# Altium integrated library LEMO Unipole And Multipole Type Connectors.IntLib: 1566 symbols (part 3 of 13) (continued)
## EEG.0K.307.CLV
designator J?
Fixed receptacle, nut fixing, with elbow contacts for printed circuit (back panel mounting), Key (G), 0K series, Multipole Type with 7 Contacts; Manufacturer: LEMO; PartNumber: EEG.0K.307.CLV; Number of contacts: 7; Contact Diameter: 0.5 mm; AWG: 28; Rated Current(A): 0; DatasheetVersion: Jun-14; PackageReference: EEG.0K.307.CLV; PackageDescription: Fixed receptacle, nut fixing, with elbow contacts for printed circuit (back panel mounting), Key(G) for Printed Circuit; ComponentLink1Description: Manufacturer URL; ComponentLink1URL: http://www.lemo.com; ComponentLink2Description: Datasheet; ComponentLink2URL: http://intra.lemo.ch/catalog/ROW/UK_English/unipole_multipole.pdf
footprint EEG.0K.307.CLV (Socket, Female, Body 14mm dia. Height 19.3 mm, Through hole)
pins: 1, 2, 3, 4, 5, 6, 7

## EEG.0K.309.CLN
designator J?
Fixed receptacle, nut fixing, with straight contacts for printed circuit (back panel mounting), Key (G), 0K series, Multipole Type with 9 Contacts; Manufacturer: LEMO; PartNumber: EEG.0K.309.CLN; Number of contacts: 9; Contact Diameter: 0.5 mm; AWG: 28; Rated Current(A): 2; DatasheetVersion: Jun-14; PackageReference: EEG.0K.309.CLN; PackageDescription: Fixed receptacle, nut fixing, with straight contacts for printed circuit (back panel mounting), Key(G) for Printed Circuit; Supplier 1: Mouser; Supplier Part Number 1: 736-EEG0K309CLN; Supplier 2: Digi-Key; Supplier Part Number 2: EEG.0K.309.CLN-ND; ComponentLink1Description: Manufacturer URL; ComponentLink1URL: http://www.lemo.com; ComponentLink2Description: Datasheet; ComponentLink2URL: http://intra.lemo.ch/catalog/ROW/UK_English/unipole_multipole.pdf
footprint EEG.0K.309.CLN (Socket, Female, Body 14mm dia. Height 17.6 mm, Through hole)
pins: 1, 2, 3, 4, 5, 6, 7, 8, 9

## EEG.1B.302.CLN
designator J?
Fixed receptacle, nut fixing with straight contacts for printed circuit(back panel mounting), Key (G), 1B series, Multipole Type with 2 Contacts; Manufacturer: LEMO; PartNumber: EEG.1B.302.CLN; Number of contacts: 2; Contact Diameter: 1.3 mm; AWG: 20; Rated Current(A): 15; DatasheetVersion: Jun-14; PackageReference: EEG.1B.302.CLN; PackageDescription: Fixed receptacle, nut fixing with straight contacts for printed circuit(back panel mounting), Key(G) for Printed Circuit; Supplier 1: Mouser; Supplier Part Number 1: 736-EEG1B302CLN; Supplier 2: Newark; Supplier Part Number 2: 96W4860; Supplier 3: Digi-Key; Supplier Part Number 3: EEG.1B.302.CLN-ND; ComponentLink1Description: Manufacturer URL; ComponentLink1URL: http://www.lemo.com; ComponentLink2Description: Datasheet; ComponentLink2URL: http://intra.lemo.ch/catalog/ROW/UK_English/unipole_multipole.pdf
footprint EEG.1B.302.CLN (Socket, Female, Body 12mm dia. Height 21.1 mm, Through hole)
pins: 1, 2

## EEG.1B.302.CLV
designator J?
Fixed receptacle, nut fixing with elbow contacts for printed circuit(back panel mounting), Key (G), 1B series, Multipole Type with 2 Contacts; Manufacturer: LEMO; PartNumber: EEG.1B.302.CLV; Number of contacts: 2; Contact Diameter: 1.3 mm; AWG: 20; Rated Current(A): 12; DatasheetVersion: Jun-14; PackageReference: EEG.1B.302.CLV; PackageDescription: Fixed receptacle, nut fixing with elbow contacts for printed circuit(back panel mounting), Key(G) for Printed Circuit; Supplier 1: Mouser; Supplier Part Number 1: 736-EEG1B302CLV; Supplier 2: Digi-Key; Supplier Part Number 2: EEG.1B.302.CLV-ND; ComponentLink1Description: Manufacturer URL; ComponentLink1URL: http://www.lemo.com; ComponentLink2Description: Datasheet; ComponentLink2URL: http://intra.lemo.ch/catalog/ROW/UK_English/unipole_multipole.pdf
footprint EEG.1B.302.CLV (Socket, Female, Body 12mm dia. Height 21.1 mm, Through hole)
pins: 1, 2

## EEG.1B.303.CLN
designator J?
Fixed receptacle, nut fixing with straight contacts for printed circuit(back panel mounting), Key (G), 1B series, Multipole Type with 3 Contacts; Manufacturer: LEMO; PartNumber: EEG.1B.303.CLN; Number of contacts: 3; Contact Diameter: 1.3 mm; AWG: 20; Rated Current(A): 12; DatasheetVersion: Jun-14; PackageReference: EEG.1B.303.CLN; PackageDescription: Fixed receptacle, nut fixing with straight contacts for printed circuit(back panel mounting), Key(G) for Printed Circuit; Supplier 1: Mouser; Supplier Part Number 1: 736-EEG1B303CLN; Supplier 2: Digi-Key; Supplier Part Number 2: EEG.1B.303.CLN-ND; ComponentLink1Description: Manufacturer URL; ComponentLink1URL: http://www.lemo.com; ComponentLink2Description: Datasheet; ComponentLink2URL: http://intra.lemo.ch/catalog/ROW/UK_English/unipole_multipole.pdf
footprint EEG.1B.303.CLN (Socket, Female, Body 12mm dia. Height 21.1 mm, Through hole)
pins: 1, 2, 3

## EEG.1B.303.CLV
designator J?
Fixed receptacle, nut fixing with elbow contacts for printed circuit(back panel mounting), Key (G), 1B series, Multipole Type with 3 Contacts; Manufacturer: LEMO; PartNumber: EEG.1B.303.CLV; Number of contacts: 3; Contact Diameter: 1.3 mm; AWG: 20; Rated Current(A): 0; DatasheetVersion: Jun-14; PackageReference: EEG.1B.303.CLV; PackageDescription: Fixed receptacle, nut fixing with elbow contacts for printed circuit(back panel mounting), Key(G) for Printed Circuit; Supplier 1: Mouser; Supplier Part Number 1: 736-EEG1B303CLV; Supplier 2: Digi-Key; Supplier Part Number 2: EEG.1B.303.CLV-ND; ComponentLink1Description: Manufacturer URL; ComponentLink1URL: http://www.lemo.com; ComponentLink2Description: Datasheet; ComponentLink2URL: http://intra.lemo.ch/catalog/ROW/UK_English/unipole_multipole.pdf
footprint EEG.1B.303.CLV (Socket, Female, Body 12mm dia. Height 21.1 mm, Through hole)
pins: 1, 2, 3

## EEG.1B.304.CLN
designator J?
Fixed receptacle, nut fixing with straight contacts for printed circuit(back panel mounting), Key (G), 1B series, Multipole Type with 4 Contacts; Manufacturer: LEMO; PartNumber: EEG.1B.304.CLN; Number of contacts: 4; Contact Diameter: 0.9 mm; AWG: 22; Rated Current(A): 10; DatasheetVersion: Jun-14; PackageReference: EEG.1B.304.CLN; PackageDescription: Fixed receptacle, nut fixing with straight contacts for printed circuit(back panel mounting), Key(G) for Printed Circuit; Supplier 1: Mouser; Supplier Part Number 1: 736-EEG1B304CLN; Supplier 2: Newark; Supplier Part Number 2: 46T1545; Supplier 3: Digi-Key; Supplier Part Number 3: EEG.1B.304.CLN-ND; ComponentLink1Description: Manufacturer URL; ComponentLink1URL: http://www.lemo.com; ComponentLink2Description: Datasheet; ComponentLink2URL: http://intra.lemo.ch/catalog/ROW/UK_English/unipole_multipole.pdf
footprint EEG.1B.304.CLN (Socket, Female, Body 12mm dia. Height 21.1 mm, Through hole)
pins: 1, 2, 3, 4

## EEG.1B.304.CLV
designator J?
Fixed receptacle, nut fixing with elbow contacts for printed circuit(back panel mounting), Key (G), 1B series, Multipole Type with 4 Contacts; Manufacturer: LEMO; PartNumber: EEG.1B.304.CLV; Number of contacts: 4; Contact Diameter: 0.9 mm; AWG: 22; Rated Current(A): 6; DatasheetVersion: Jun-14; PackageReference: EEG.1B.304.CLV; PackageDescription: Fixed receptacle, nut fixing with elbow contacts for printed circuit(back panel mounting), Key(G) for Printed Circuit; Supplier 1: Mouser; Supplier Part Number 1: 736-EEG1B304CLV; Supplier 2: Digi-Key; Supplier Part Number 2: EEG.1B.304.CLV-ND; ComponentLink1Description: Manufacturer URL; ComponentLink1URL: http://www.lemo.com; ComponentLink2Description: Datasheet; ComponentLink2URL: http://intra.lemo.ch/catalog/ROW/UK_English/unipole_multipole.pdf
footprint EEG.1B.304.CLV (Socket, Female, Body 12mm dia. Height 21.1 mm, Through hole)
pins: 1, 2, 3, 4

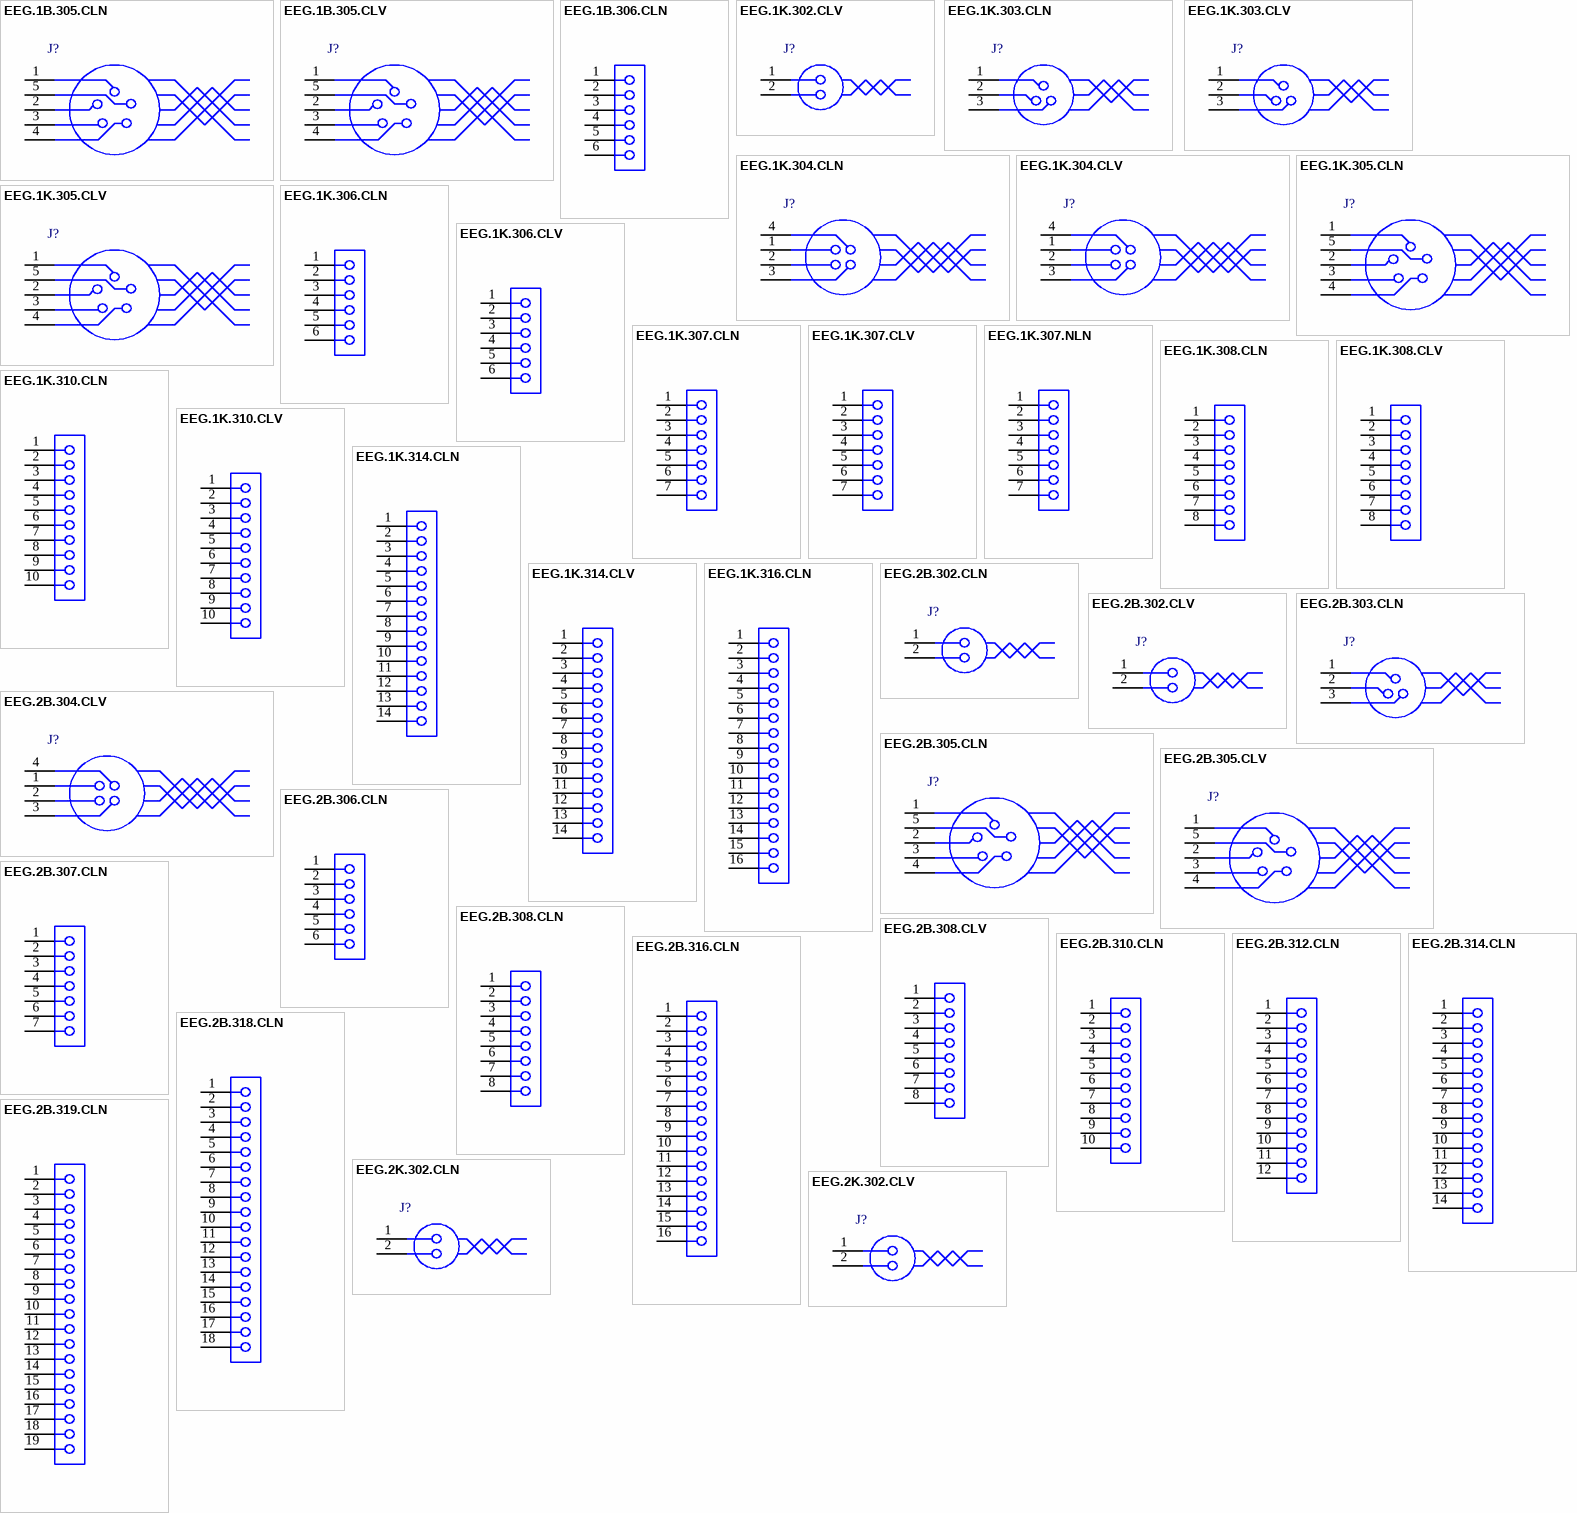
[diagram p10: symbols EEG.1B.305.CLN to EEG.2K.302.CLV]

## EEG.1B.305.CLN
designator J?
Fixed receptacle, nut fixing with straight contacts for printed circuit(back panel mounting), Key (G), 1B series, Multipole Type with 5 Contacts; Manufacturer: LEMO; PartNumber: EEG.1B.305.CLN; Number of contacts: 5; Contact Diameter: 0.9 mm; AWG: 22; Rated Current(A): 9; DatasheetVersion: Jun-14; PackageReference: EEG.1B.305.CLN; PackageDescription: Fixed receptacle, nut fixing with straight contacts for printed circuit(back panel mounting), Key(G) for Printed Circuit; Supplier 1: Mouser; Supplier Part Number 1: 736-EEG1B305CLN; Supplier 2: Newark; Supplier Part Number 2: 85R0930; Supplier 3: Digi-Key; Supplier Part Number 3: EEG.1B.305.CLN-ND; ComponentLink1Description: Manufacturer URL; ComponentLink1URL: http://www.lemo.com; ComponentLink2Description: Datasheet; ComponentLink2URL: http://intra.lemo.ch/catalog/ROW/UK_English/unipole_multipole.pdf
footprint EEG.1B.305.CLN (Socket, Female, Body 12mm dia. Height 21.1 mm, Through hole)
pins: 1, 2, 3, 4, 5

## EEG.1B.305.CLV
designator J?
Fixed receptacle, nut fixing with elbow contacts for printed circuit(back panel mounting), Key (G), 1B series, Multipole Type with 5 Contacts; Manufacturer: LEMO; PartNumber: EEG.1B.305.CLV; Number of contacts: 5; Contact Diameter: 0.9 mm; AWG: 22; Rated Current(A): 6; DatasheetVersion: Jun-14; PackageReference: EEG.1B.305.CLV; PackageDescription: Fixed receptacle, nut fixing with elbow contacts for printed circuit(back panel mounting), Key(G) for Printed Circuit; Supplier 1: Mouser; Supplier Part Number 1: 736-EEG1B305CLV; Supplier 2: Digi-Key; Supplier Part Number 2: EEG.1B.305.CLV-ND; ComponentLink1Description: Manufacturer URL; ComponentLink1URL: http://www.lemo.com; ComponentLink2Description: Datasheet; ComponentLink2URL: http://intra.lemo.ch/catalog/ROW/UK_English/unipole_multipole.pdf
footprint EEG.1B.305.CLV (Socket, Female, Body 12mm dia. Height 21.1 mm, Through hole)
pins: 1, 2, 3, 4, 5

## EEG.1B.306.CLN
designator J?
Fixed receptacle, nut fixing with straight contacts for printed circuit(back panel mounting), Key (G), 1B series, Multipole Type with 6 Contacts; Manufacturer: LEMO; PartNumber: EEG.1B.306.CLN; Number of contacts: 6; Contact Diameter: 0.7 mm; AWG: 24; Rated Current(A): 7; DatasheetVersion: Jun-14; PackageReference: EEG.1B.306.CLN; PackageDescription: Fixed receptacle, nut fixing with straight contacts for printed circuit(back panel mounting), Key(G) for Printed Circuit; Supplier 1: Mouser; Supplier Part Number 1: 736-EEG1B306CLN; Supplier 2: Newark; Supplier Part Number 2: 85R0931; Supplier 3: Digi-Key; Supplier Part Number 3: EEG.1B.306.CLN-ND; ComponentLink1Description: Manufacturer URL; ComponentLink1URL: http://www.lemo.com; ComponentLink2Description: Datasheet; ComponentLink2URL: http://intra.lemo.ch/catalog/ROW/UK_English/unipole_multipole.pdf
footprint EEG.1B.306.CLN (Socket, Female, Body 12mm dia. Height 21.1 mm, Through hole)
pins: 1, 2, 3, 4, 5, 6

## EEG.1K.302.CLV
designator J?
Fixed receptacle, nut fixing, with elbow contacts for printed circuit (back panel mounting), Key (G), 1K series, Multipole Type with 2 Contacts; Manufacturer: LEMO; PartNumber: EEG.1K.302.CLV; Number of contacts: 2; Contact Diameter: 1.3 mm; AWG: 20; Rated Current(A): 12; DatasheetVersion: Jun-14; PackageReference: EEG.1K.302.CLV; PackageDescription: Fixed receptacle, nut fixing, with elbow contacts for printed circuit (back panel mounting), Key(G) for Printed Circuit; ComponentLink1Description: Manufacturer URL; ComponentLink1URL: http://www.lemo.com; ComponentLink2Description: Datasheet; ComponentLink2URL: http://intra.lemo.ch/catalog/ROW/UK_English/unipole_multipole.pdf
footprint EEG.1K.302.CLV (Socket, Female, Body 16mm dia. Height 24.3 mm, Through hole)
pins: 1, 2

## EEG.1K.303.CLN
designator J?
Fixed receptacle, nut fixing, with straight contacts for printed circuit (back panel mounting), Key (G), 1K series, Multipole Type with 3 Contacts; Manufacturer: LEMO; PartNumber: EEG.1K.303.CLN; Number of contacts: 3; Contact Diameter: 1.3 mm; AWG: 20; Rated Current(A): 12; DatasheetVersion: Jun-14; PackageReference: EEG.1K.303.CLN; PackageDescription: Fixed receptacle, nut fixing, with straight contacts for printed circuit (back panel mounting), Key(G) for Printed Circuit; Supplier 1: Mouser; Supplier Part Number 1: 736-EEG1K303CLN; Supplier 2: Digi-Key; Supplier Part Number 2: EEG.1K.303.CLN-ND; ComponentLink1Description: Manufacturer URL; ComponentLink1URL: http://www.lemo.com; ComponentLink2Description: Datasheet; ComponentLink2URL: http://intra.lemo.ch/catalog/ROW/UK_English/unipole_multipole.pdf
footprint EEG.1K.303.CLN (Socket, Female, Body 16mm dia., Through hole)
pins: 1, 2, 3

## EEG.1K.303.CLV
designator J?
Fixed receptacle, nut fixing, with elbow contacts for printed circuit (back panel mounting), Key (G), 1K series, Multipole Type with 3 Contacts; Manufacturer: LEMO; PartNumber: EEG.1K.303.CLV; Number of contacts: 3; Contact Diameter: 1.3 mm; AWG: 20; Rated Current(A): 0; DatasheetVersion: Jun-14; PackageReference: EEG.1K.303.CLV; PackageDescription: Fixed receptacle, nut fixing, with elbow contacts for printed circuit (back panel mounting), Key(G) for Printed Circuit; Supplier 1: Mouser; Supplier Part Number 1: 736-EEG1K303CLV; Supplier 2: Digi-Key; Supplier Part Number 2: EEG.1K.303.CLV-ND; ComponentLink1Description: Manufacturer URL; ComponentLink1URL: http://www.lemo.com; ComponentLink2Description: Datasheet; ComponentLink2URL: http://intra.lemo.ch/catalog/ROW/UK_English/unipole_multipole.pdf
footprint EEG.1K.303.CLV (Socket, Female, Body 16mm dia. Height 24.3 mm, Through hole)
pins: 1, 2, 3

## EEG.1K.304.CLN
designator J?
Fixed receptacle, nut fixing, with straight contacts for printed circuit (back panel mounting), Key (G), 1K series, Multipole Type with 4 Contacts; Manufacturer: LEMO; PartNumber: EEG.1K.304.CLN; Number of contacts: 4; Contact Diameter: 0.9 mm; AWG: 22; Rated Current(A): 10; DatasheetVersion: Jun-14; PackageReference: EEG.1K.304.CLN; PackageDescription: Fixed receptacle, nut fixing, with straight contacts for printed circuit (back panel mounting), Key(G) for Printed Circuit; Supplier 1: Mouser; Supplier Part Number 1: 736-EEG1K304CLN; Supplier 2: Digi-Key; Supplier Part Number 2: EEG.1K.304.CLN-ND; ComponentLink1Description: Manufacturer URL; ComponentLink1URL: http://www.lemo.com; ComponentLink2Description: Datasheet; ComponentLink2URL: http://intra.lemo.ch/catalog/ROW/UK_English/unipole_multipole.pdf
footprint EEG.1K.304.CLN (Socket, Female, Body 16mm dia., Through hole)
pins: 1, 2, 3, 4

## EEG.1K.304.CLV
designator J?
Fixed receptacle, nut fixing, with elbow contacts for printed circuit (back panel mounting), Key (G), 1K series, Multipole Type with 4 Contacts; Manufacturer: LEMO; PartNumber: EEG.1K.304.CLV; Number of contacts: 4; Contact Diameter: 0.9 mm; AWG: 22; Rated Current(A): 6; DatasheetVersion: Jun-14; PackageReference: EEG.1K.304.CLV; PackageDescription: Fixed receptacle, nut fixing, with elbow contacts for printed circuit (back panel mounting), Key(G) for Printed Circuit; ComponentLink1Description: Manufacturer URL; ComponentLink1URL: http://www.lemo.com; ComponentLink2Description: Datasheet; ComponentLink2URL: http://intra.lemo.ch/catalog/ROW/UK_English/unipole_multipole.pdf
footprint EEG.1K.304.CLV (Socket, Female, Body 16mm dia. Height 24.3 mm, Through hole)
pins: 1, 2, 3, 4

## EEG.1K.305.CLN
designator J?
Fixed receptacle, nut fixing, with straight contacts for printed circuit (back panel mounting), Key (G), 1K series, Multipole Type with 5 Contacts; Manufacturer: LEMO; PartNumber: EEG.1K.305.CLN; Number of contacts: 5; Contact Diameter: 0.9 mm; AWG: 22; Rated Current(A): 9; DatasheetVersion: Jun-14; PackageReference: EEG.1K.305.CLN; PackageDescription: Fixed receptacle, nut fixing, with straight contacts for printed circuit (back panel mounting), Key(G) for Printed Circuit; Supplier 1: Mouser; Supplier Part Number 1: 736-EEG1K305CLN; Supplier 2: Digi-Key; Supplier Part Number 2: EEG.1K.305.CLN-ND; ComponentLink1Description: Manufacturer URL; ComponentLink1URL: http://www.lemo.com; ComponentLink2Description: Datasheet; ComponentLink2URL: http://intra.lemo.ch/catalog/ROW/UK_English/unipole_multipole.pdf
footprint EEG.1K.305.CLN (Socket, Female, Body 16mm dia., Through hole)
pins: 1, 2, 3, 4, 5

## EEG.1K.305.CLV
designator J?
Fixed receptacle, nut fixing, with elbow contacts for printed circuit (back panel mounting), Key (G), 1K series, Multipole Type with 5 Contacts; Manufacturer: LEMO; PartNumber: EEG.1K.305.CLV; Number of contacts: 5; Contact Diameter: 0.9 mm; AWG: 22; Rated Current(A): 6; DatasheetVersion: Jun-14; PackageReference: EEG.1K.305.CLV; PackageDescription: Fixed receptacle, nut fixing, with elbow contacts for printed circuit (back panel mounting), Key(G) for Printed Circuit; Supplier 1: Mouser; Supplier Part Number 1: 736-EEG1K305CLV; Supplier 2: Digi-Key; Supplier Part Number 2: EEG.1K.305.CLV-ND; ComponentLink1Description: Manufacturer URL; ComponentLink1URL: http://www.lemo.com; ComponentLink2Description: Datasheet; ComponentLink2URL: http://intra.lemo.ch/catalog/ROW/UK_English/unipole_multipole.pdf
footprint EEG.1K.305.CLV (Socket, Female, Body 16mm dia. Height 24.3 mm, Through hole)
pins: 1, 2, 3, 4, 5

## EEG.1K.306.CLN
designator J?
Fixed receptacle, nut fixing, with straight contacts for printed circuit (back panel mounting), Key (G), 1K series, Multipole Type with 6 Contacts; Manufacturer: LEMO; PartNumber: EEG.1K.306.CLN; Number of contacts: 6; Contact Diameter: 0.7 mm; AWG: 24; Rated Current(A): 7; DatasheetVersion: Jun-14; PackageReference: EEG.1K.306.CLN; PackageDescription: Fixed receptacle, nut fixing, with straight contacts for printed circuit (back panel mounting), Key(G) for Printed Circuit; Supplier 1: Mouser; Supplier Part Number 1: 736-EEG1K306CLN; Supplier 2: Digi-Key; Supplier Part Number 2: EEG.1K.306.CLN-ND; ComponentLink1Description: Manufacturer URL; ComponentLink1URL: http://www.lemo.com; ComponentLink2Description: Datasheet; ComponentLink2URL: http://intra.lemo.ch/catalog/ROW/UK_English/unipole_multipole.pdf
footprint EEG.1K.306.CLN (Socket, Female, Body 16mm dia., Through hole)
pins: 1, 2, 3, 4, 5, 6

## EEG.1K.306.CLV
designator J?
Fixed receptacle, nut fixing, with elbow contacts for printed circuit (back panel mounting), Key (G), 1K series, Multipole Type with 6 Contacts; Manufacturer: LEMO; PartNumber: EEG.1K.306.CLV; Number of contacts: 6; Contact Diameter: 0.7 mm; AWG: 24; DatasheetVersion: Jun-14; PackageReference: EEG.1K.306.CLV; PackageDescription: Fixed receptacle, nut fixing, with elbow contacts for printed circuit (back panel mounting), Key(G) for Printed Circuit; Supplier 1: Mouser; Supplier Part Number 1: 736-EEG1K306CLV; Supplier 2: Digi-Key; Supplier Part Number 2: EEG.1K.306.CLV-ND; Rated Current(A): 6; ComponentLink1Description: Manufacturer URL; ComponentLink1URL: http://www.lemo.com; ComponentLink2Description: Datasheet; ComponentLink2URL: http://intra.lemo.ch/catalog/ROW/UK_English/unipole_multipole.pdf
footprint EEG.1K.306.CLV (Socket, Female, Body 16mm dia. Height 24.3 mm, Through hole)
pins: 1, 2, 3, 4, 5, 6

## EEG.1K.307.CLN
designator J?
Fixed receptacle, nut fixing, with straight contacts for printed circuit (back panel mounting), Key (G), 1K series, Multipole Type with 7 Contacts; Manufacturer: LEMO; PartNumber: EEG.1K.307.CLN; Number of contacts: 7; Contact Diameter: 0.7 mm; AWG: 24; DatasheetVersion: Jun-14; PackageReference: EEG.1K.307.CLN; PackageDescription: Fixed receptacle, nut fixing, with straight contacts for printed circuit (back panel mounting), Key(G) for Printed Circuit; Supplier 1: Mouser; Supplier Part Number 1: 736-EEG1K307CLN; Supplier 2: Digi-Key; Supplier Part Number 2: EEG.1K.307.CLN-ND; Rated Current(A): 7; ComponentLink1Description: Manufacturer URL; ComponentLink1URL: http://www.lemo.com; ComponentLink2Description: Datasheet; ComponentLink2URL: http://intra.lemo.ch/catalog/ROW/UK_English/unipole_multipole.pdf
footprint EEG.1K.307.CLN (Socket, Female, Body 16mm dia., Through hole)
pins: 1, 2, 3, 4, 5, 6, 7

## EEG.1K.307.CLV
designator J?
Fixed receptacle, nut fixing, with elbow contacts for printed circuit (back panel mounting), Key (G), 1K series, Multipole Type with 7 Contacts; Manufacturer: LEMO; PartNumber: EEG.1K.307.CLV; Number of contacts: 7; Contact Diameter: 0.7 mm; AWG: 24; Rated Current(A): 6; DatasheetVersion: Jun-14; PackageReference: EEG.1K.307.CLV; PackageDescription: Fixed receptacle, nut fixing, with elbow contacts for printed circuit (back panel mounting), Key(G) for Printed Circuit; Supplier 1: Mouser; Supplier Part Number 1: 736-EEG1K307CLV; Supplier 2: Newark; Supplier Part Number 2: 56X8770; Supplier 3: Digi-Key; Supplier Part Number 3: EEG.1K.307.CLV-ND; ComponentLink1Description: Manufacturer URL; ComponentLink1URL: http://www.lemo.com; ComponentLink2Description: Datasheet; ComponentLink2URL: http://intra.lemo.ch/catalog/ROW/UK_English/unipole_multipole.pdf
footprint EEG.1K.307.CLV (Socket, Female, Body 16mm dia. Height 24.3 mm, Through hole)
pins: 1, 2, 3, 4, 5, 6, 7

## EEG.1K.307.NLN
designator J?
Fixed receptacle, nut fixing, with straight contacts for printed circuit (back panel mounting), Key (G), 1K series, Multipole Type with 7 Contacts; Manufacturer: LEMO; PartNumber: EEG.1K.307.NLN; Number of contacts: 7; Contact Diameter: 0.7 mm; AWG: 24; DatasheetVersion: Jun-14; PackageReference: EEG.1K.307.NLN; PackageDescription: Fixed receptacle, nut fixing, with straight contacts for printed circuit (back panel mounting), Key(G) for Printed Circuit; Rated Current(A): 7; ComponentLink1Description: Manufacturer URL; ComponentLink1URL: http://www.lemo.com; ComponentLink2Description: Datasheet; ComponentLink2URL: http://intra.lemo.ch/catalog/ROW/UK_English/unipole_multipole.pdf
footprint EEG.1K.307.NLN (Socket, Female, Body 16mm dia., Through hole)
pins: 1, 2, 3, 4, 5, 6, 7

## EEG.1K.308.CLN
designator J?
Fixed receptacle, nut fixing, with straight contacts for printed circuit (back panel mounting), Key (G), 1K series, Multipole Type with 8 Contacts; Manufacturer: LEMO; PartNumber: EEG.1K.308.CLN; Number of contacts: 8; Contact Diameter: 0.7 mm; AWG: 24; Rated Current(A): 5; DatasheetVersion: Jun-14; PackageReference: EEG.1K.308.CLN; PackageDescription: Fixed receptacle, nut fixing, with straight contacts for printed circuit (back panel mounting), Key(G) for Printed Circuit; Supplier 1: Mouser; Supplier Part Number 1: 736-EEG1K308CLN; Supplier 2: Digi-Key; Supplier Part Number 2: EEG.1K.308.CLN-ND; ComponentLink1Description: Manufacturer URL; ComponentLink1URL: http://www.lemo.com; ComponentLink2Description: Datasheet; ComponentLink2URL: http://intra.lemo.ch/catalog/ROW/UK_English/unipole_multipole.pdf
footprint EEG.1K.308.CLN (Socket, Female, Body 16mm dia., Through hole)
pins: 1, 2, 3, 4, 5, 6, 7, 8

## EEG.1K.308.CLV
designator J?
Fixed receptacle, nut fixing, with elbow contacts for printed circuit (back panel mounting), Key (G), 1K series, Multipole Type with 8 Contacts; Manufacturer: LEMO; PartNumber: EEG.1K.308.CLV; Number of contacts: 8; Contact Diameter: 0.7 mm; AWG: 24; Rated Current(A): 0; DatasheetVersion: Jun-14; PackageReference: EEG.1K.308.CLV; PackageDescription: Fixed receptacle, nut fixing, with elbow contacts for printed circuit (back panel mounting), Key(G) for Printed Circuit; Supplier 1: Mouser; Supplier Part Number 1: 736-EEG1K308CLV; Supplier 2: Newark; Supplier Part Number 2: 68R6339; Supplier 3: Digi-Key; Supplier Part Number 3: 1124-1333-ND; ComponentLink1Description: Manufacturer URL; ComponentLink1URL: http://www.lemo.com; ComponentLink2Description: Datasheet; ComponentLink2URL: http://intra.lemo.ch/catalog/ROW/UK_English/unipole_multipole.pdf
footprint EEG.1K.308.CLV (Socket, Female, Body 16mm dia. Height 24.3 mm, Through hole)
pins: 1, 2, 3, 4, 5, 6, 7, 8

## EEG.1K.310.CLN
designator J?
Fixed receptacle, nut fixing, with straight contacts for printed circuit (back panel mounting), Key (G), 1K series, Multipole Type with 10 Contacts; Manufacturer: LEMO; PartNumber: EEG.1K.310.CLN; Number of contacts: 10; Contact Diameter: 0.5 mm; AWG: 28; Rated Current(A): 2.5; DatasheetVersion: Jun-14; PackageReference: EEG.1K.310.CLN; PackageDescription: Fixed receptacle, nut fixing, with straight contacts for printed circuit (back panel mounting), Key(G) for Printed Circuit; Supplier 1: Mouser; Supplier Part Number 1: 736-EEG1K310CLN; Supplier 2: Digi-Key; Supplier Part Number 2: EEG.1K.310.CLN-ND; ComponentLink1Description: Manufacturer URL; ComponentLink1URL: http://www.lemo.com; ComponentLink2Description: Datasheet; ComponentLink2URL: http://intra.lemo.ch/catalog/ROW/UK_English/unipole_multipole.pdf
footprint EEG.1K.310.CLN (Socket, Female, Body 16mm dia., Through hole)
pins: 1, 2, 3, 4, 5, 6, 7, 8, 9, 10

## EEG.1K.310.CLV
designator J?
Fixed receptacle, nut fixing, with elbow contacts for printed circuit (back panel mounting), Key (G), 1K series, Multipole Type with 10 Contacts; Manufacturer: LEMO; PartNumber: EEG.1K.310.CLV; Number of contacts: 10; Contact Diameter: 0.5 mm; AWG: 28; Rated Current(A): 0; DatasheetVersion: Jun-14; PackageReference: EEG.1K.310.CLV; PackageDescription: Fixed receptacle, nut fixing, with elbow contacts for printed circuit (back panel mounting), Key(G) for Printed Circuit; Supplier 1: Mouser; Supplier Part Number 1: 736-EEG1K310CLV; Supplier 2: Digi-Key; Supplier Part Number 2: EEG.1K.310.CLV-ND; ComponentLink1Description: Manufacturer URL; ComponentLink1URL: http://www.lemo.com; ComponentLink2Description: Datasheet; ComponentLink2URL: http://intra.lemo.ch/catalog/ROW/UK_English/unipole_multipole.pdf
footprint EEG.1K.310.CLV (Socket, Female, Body 16mm dia. Height 24.3 mm, Through hole)
pins: 1, 2, 3, 4, 5, 6, 7, 8, 9, 10

## EEG.1K.314.CLN
designator J?
Fixed receptacle, nut fixing, with straight contacts for printed circuit (back panel mounting), Key (G), 1K series, Multipole Type with 14 Contacts; Manufacturer: LEMO; PartNumber: EEG.1K.314.CLN; Number of contacts: 14; Contact Diameter: 0.5 mm; AWG: 28; Rated Current(A): 2; DatasheetVersion: Jun-14; PackageReference: EEG.1K.314.CLN; PackageDescription: Fixed receptacle, nut fixing, with straight contacts for printed circuit (back panel mounting), Key(G) for Printed Circuit; Supplier 1: Mouser; Supplier Part Number 1: 736-EEG1K314CLN; Supplier 2: Newark; Supplier Part Number 2: 12R0302; Supplier 3: Digi-Key; Supplier Part Number 3: EEG.1K.314.CLN-ND; ComponentLink1Description: Manufacturer URL; ComponentLink1URL: http://www.lemo.com; ComponentLink2Description: Datasheet; ComponentLink2URL: http://intra.lemo.ch/catalog/ROW/UK_English/unipole_multipole.pdf
footprint EEG.1K.314.CLN (Socket, Female, Body 16mm dia., Through hole)
pins: 1, 2, 3, 4, 5, 6, 7, 8, 9, 10, 11, 12, 13, 14

## EEG.1K.314.CLV
designator J?
Fixed receptacle, nut fixing, with elbow contacts for printed circuit (back panel mounting), Key (G), 1K series, Multipole Type with 14 Contacts; Manufacturer: LEMO; PartNumber: EEG.1K.314.CLV; Number of contacts: 14; Contact Diameter: 0.5 mm; AWG: 28; Rated Current(A): 0; DatasheetVersion: Jun-14; PackageReference: EEG.1K.314.CLV; PackageDescription: Fixed receptacle, nut fixing, with elbow contacts for printed circuit (back panel mounting), Key(G) for Printed Circuit; Supplier 1: Mouser; Supplier Part Number 1: 736-EEG1K314CLV; Supplier 2: Digi-Key; Supplier Part Number 2: EEG.1K.314.CLV-ND; ComponentLink1Description: Manufacturer URL; ComponentLink1URL: http://www.lemo.com; ComponentLink2Description: Datasheet; ComponentLink2URL: http://intra.lemo.ch/catalog/ROW/UK_English/unipole_multipole.pdf
footprint EEG.1K.314.CLV (Socket, Female, Body 16mm dia. Height 24.3 mm, Through hole)
pins: 1, 2, 3, 4, 5, 6, 7, 8, 9, 10, 11, 12, 13, 14

## EEG.1K.316.CLN
designator J?
Fixed receptacle, nut fixing, with straight contacts for printed circuit (back panel mounting), Key (G), 1K series, Multipole Type with 16 Contacts; Manufacturer: LEMO; PartNumber: EEG.1K.316.CLN; Number of contacts: 16; Contact Diameter: 0.5 mm; AWG: 28; Rated Current(A): 1.5; DatasheetVersion: Jun-14; PackageReference: EEG.1K.316.CLN; PackageDescription: Fixed receptacle, nut fixing, with straight contacts for printed circuit (back panel mounting), Key(G) for Printed Circuit; Supplier 1: Mouser; Supplier Part Number 1: 736-EEG1K316CLN; Supplier 2: Digi-Key; Supplier Part Number 2: EEG.1K.316.CLN-ND; ComponentLink1Description: Manufacturer URL; ComponentLink1URL: http://www.lemo.com; ComponentLink2Description: Datasheet; ComponentLink2URL: http://intra.lemo.ch/catalog/ROW/UK_English/unipole_multipole.pdf
footprint EEG.1K.316.CLN (Socket, Female, Body 16mm dia., Through hole)
pins: 1, 2, 3, 4, 5, 6, 7, 8, 9, 10, 11, 12, 13, 14, 15, 16

## EEG.2B.302.CLN
designator J?
Fixed receptacle, nut fixing with straight contacts for printed circuit(back panel mounting), Key (G), 2B series, Multipole Type with 2 Contacts; Manufacturer: LEMO; PartNumber: EEG.2B.302.CLN; Number of contacts: 2; Contact Diameter: 2 mm; AWG: 14; Rated Current(A): 25; DatasheetVersion: Jun-14; PackageReference: EEG.2B.302.CLN; PackageDescription: Fixed receptacle, nut fixing with straight contacts for printed circuit(back panel mounting), Key(G) for Printed Circuit; Supplier 1: Mouser; Supplier Part Number 1: 736-EEG.2B.302.CLN; Supplier 2: Digi-Key; Supplier Part Number 2: EEG.2B.302.CLN-ND; ComponentLink1Description: Manufacturer URL; ComponentLink1URL: http://www.lemo.com; ComponentLink2Description: Datasheet; ComponentLink2URL: http://intra.lemo.ch/catalog/ROW/UK_English/unipole_multipole.pdf
footprint EEG.2B.302.CLN (Socket, Female, Body 15mm dia. Height 24.6 mm, Through hole)
pins: 1, 2

## EEG.2B.302.CLV
designator J?
Fixed receptacle, nut fixing with elbow contacts for printed circuit(back panel mounting), Key (G), 2B series, Multipole Type with 2 Contacts; Manufacturer: LEMO; PartNumber: EEG.2B.302.CLV; Number of contacts: 2; Contact Diameter: 2 mm; AWG: 14; Rated Current(A): 12; DatasheetVersion: Jun-14; PackageReference: EEG.2B.302.CLV; PackageDescription: Fixed receptacle, nut fixing with elbow contacts for printed circuit(back panel mounting), Key(G) for Printed Circuit; ComponentLink1Description: Manufacturer URL; ComponentLink1URL: http://www.lemo.com; ComponentLink2Description: Datasheet; ComponentLink2URL: http://intra.lemo.ch/catalog/ROW/UK_English/unipole_multipole.pdf
footprint EEG.2B.302.CLV (Socket, Female, Body 15mm dia. Height 24.6 mm, Through hole)
pins: 1, 2